# Altium footprint library PCBLIB.PcbLib: 557 footprints (part 25 of 36)
Each footprint in its own frame and in the unit in brackets; x right, y up, seen from the top. Pads: shape width x height; smd on the part's side, far side on the other; paste and mask are expansions set on the pad; w line width, h text height; cw(c..) or ccw(c..) is an arc to the next point about the centre after c.
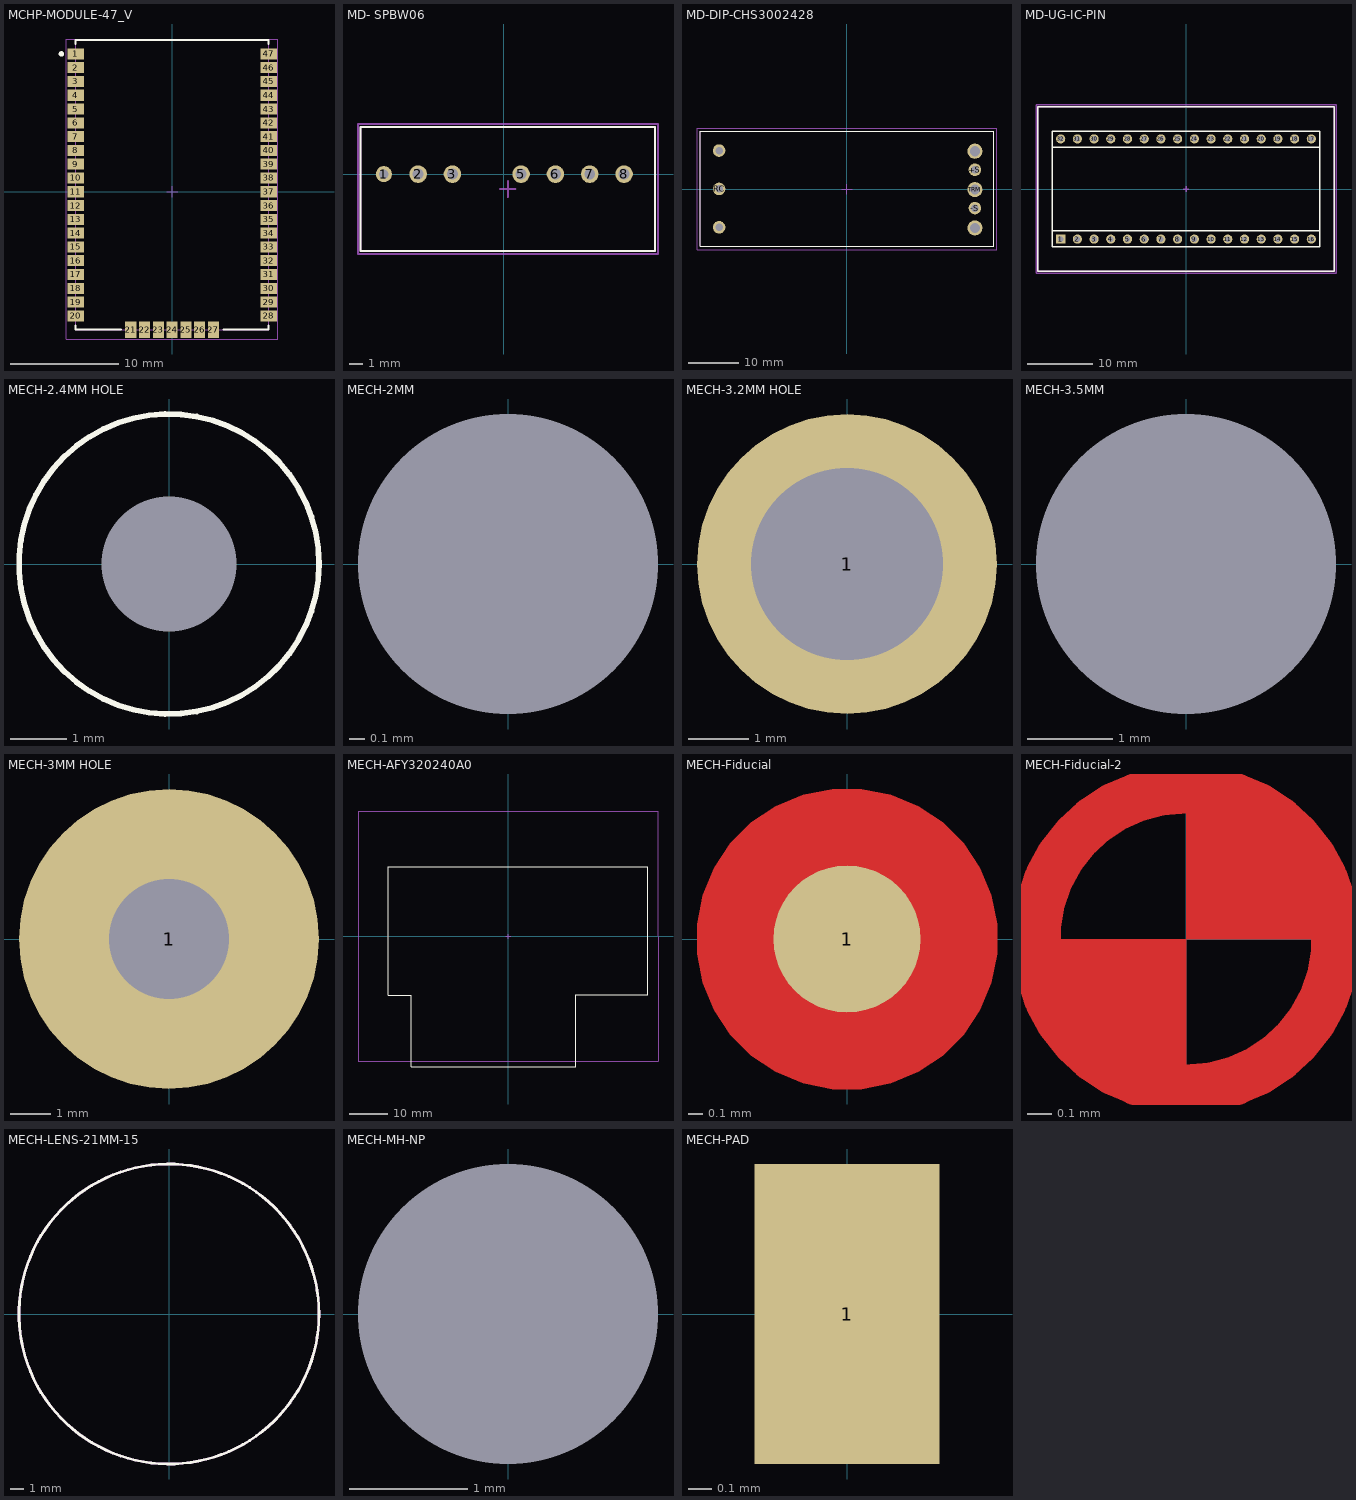
[diagram p24: the footprints below, top view; thin cyan lines are the x and y axes]

## MCHP-MODULE-47_V [mil] "SMD, 47-Leads, Body 26.67x17.78mm, Pitch 1.27mm"
height 131.5
pads (47):
  rect 60x40 smd mask+3.94: 1(-350,500) 2(-350,450) 3(-350,400) 4(-350,350) 5(-350,300) 6(-350,250) 7(-350,200) 8(-350,150) 9(-350,100) 10(-350,50) 11(-350,0) 12(-350,-50) 13(-350,-100) 14(-350,-150) 15(-350,-200) 16(-350,-250) 17(-350,-300) 18(-350,-350) 19(-350,-400) 20(-350,-450) 28(350,-450) 29(350,-400) 30(350,-350) 31(350,-300) 32(350,-250) 33(350,-200) 34(350,-150) 35(350,-100) 36(350,-50) 37(350,0) 38(350,50) 39(350,100) 40(350,150) 41(350,200) 42(350,250) 43(350,300) 44(350,350) 45(350,400) 46(350,450) 47(350,500)
  rect 40x60 smd mask+3.94: 21(-150,-500) 22(-100,-500) 23(-50,-500) 24(0,-500) 25(50,-500) 26(100,-500) 27(150,-500)
Top Overlay:
  circle w9.84: c-401.65,500 r4.92
  lines w7.87: -350,-485.75 -350,-500 -185.75,-500 ; -350,535.75 -350,550 350,550 350,535.75 ; 185.75,-500 350,-500 350,-485.75
Mechanical 15:
  lines w1.97: -383.94,-533.94 -383.94,553.94 383.94,553.94 383.94,-533.94 -383.94,-533.94
  lines w3.94: -19.68,0 19.69,0 ; 0,-19.68 0,19.68
ASM Top:
  lines w3.94: -350,-500 350,-500 350,550 -350,550 -350,-500
  text ".designator" at -74.8,0 h31.5
3D body "User Library-RN2483-1.STEP": height 131.5, standoff -0.04, extent -350,-500 350,550

## MD- SPBW06 [mm]
height 11.1
pads (7):
  round 1.2 hole 0.7 mask+0.05: 1(-8.89,0)
  round 1.3 hole 0.8 mask+0.05: 2(-6.35,0) 3(-3.81,0) 5(1.27,0) 6(3.81,0) 7(6.35,0) 8(8.89,0)
Top Overlay:
  lines w0.15: -10.614,-5.7 11.186,-5.7 11.186,3.5 -10.614,3.5 -10.614,-5.7
Mechanical 15:
  lines w0.15: -0.3,-1.1 0.286,-1.1 ; 0.286,-0.514 0.286,-1.1 ; 0.3,-1.7 0.286,-1.686 0.286,-1.1 ; 0.871,-1.1 0.286,-1.1 ; -10.8,-5.9 -10.8,3.7 11.4,3.7 11.4,-5.9 -10.8,-5.9
ASM Top:
  lines w0.15: -10.614,-5.7 -10.614,3.5 11.186,3.5 11.186,-5.7 -10.614,-5.7
  text ".designator" at -0.5,-1.1 h1.5
3D body "SPBW06.STEP": height 11.11, standoff -4.09, extent -10.614,-5.7 11.186,3.5

## MD-DIP-CHS3002428 [mm]
height 11
pads (8):
  round 2.5 hole 1.5 unplated: +S(25.4,3.874) +VIN(-25.4,7.684) -S(25.4,-3.746) -VIN(-25.4,-7.556) RC(-25.4,0.064)
  round 3 hole 2 unplated: +VOUT(25.4,7.555) -VOUT(25.4,-7.684) TRM(25.4,-0.065)
Top Overlay:
  lines w0.15: -29.2,-11.366 -29.2,11.494 29.2,11.494 29.2,-11.366 -29.2,-11.366
Mechanical 15:
  lines w0.15: -1,0 0,0 ; 0,-1 0,0 ; 0,1 0,0 ; 1,0 0,0 ; -29.8,-12 -29.8,11.75 -29.8,12.1 29.8,12.1 29.8,-12 -29.8,-12
ASM Top:
  lines w0.15: 29.2,-11.366 -29.2,-11.366 -29.2,11.494 29.2,11.494 29.2,-11.366 ; 29.2,-11.366 29.2,-11.366
  text ".designator" at -0.2,-0.1 h1.5
3D body "chs300(stp).stp": height 10.91, standoff -3.17, extent -29.2,-11.366 29.2,11.494

## MD-UG-IC-PIN [mil]
height 433.07
pads (32):
  rect 55x55 / inner round 0 / far side rect 55x55 hole 32: 1(-750,-300)
  round 55 / inner round 0 / far side round 55 hole 32: 2(-650,-300) 3(-550,-300) 4(-450,-300) 5(-350,-300) 6(-250,-300) 7(-150,-300) 8(-50,-300) 9(50,-300) 10(150,-300) 11(250,-300) 12(350,-300) 13(450,-300) 14(550,-300) 15(650,-300) 16(750,-300) 17(750,300) 18(650,300) 19(550,300) 20(450,300) 21(350,300) 22(250,300) 23(150,300) 24(50,300) 25(-50,300) 26(-150,300) 27(-250,300) 28(-350,300) 29(-450,300) 30(-550,300) 31(-650,300) 32(-750,300)
Top Overlay:
  lines w3: -799.21,208.66 -799.21,-208.66 ; 799.21,-208.66 799.21,208.66 ; -799.21,-208.66 -799.21,-346.46 799.21,-346.46 799.21,208.66 ; -799.21,-208.66 -799.21,346.46 799.21,346.46 799.21,208.66
  lines w7.87: -799.21,-250.79 799.21,-250.79 ; -799.21,250.79 799.21,250.79 ; -885.83,-492.13 885.83,-492.13 885.83,492.13 -885.83,492.13 -885.83,-492.13 ; -799.21,-346.46 799.21,-346.46 799.21,346.46 -799.21,346.46 -799.21,-346.46
Mechanical 15:
  lines w7.87: -15.75,0 15.75,0 ; 0,0 0,-15.75 0,15.75 ; -897.64,-503.94 -897.64,503.94 897.64,503.94 897.64,-503.94 893.7,-503.94 -897.64,-503.94
ASM Top:
  lines w7.87: -885.83,-492.13 -885.83,492.13 885.83,492.13 885.83,-492.13 -885.83,-492.13
  text ".designator" at -3.94,9.41 h31.5
3D body: height 62.99, standoff 0, extent -885.83,-492.13 885.83,492.13

## MECH-2.4MM HOLE [mm]
pads (1):
  round 0.1 hole 2.4 unplated: 1(0,0)
Top Overlay:
  circle w0.102: c0,0 r2.67

## MECH-2MM [mil]
pads (1):
  round 1 hole 78 unplated: 1(0,0)

## MECH-3.2MM HOLE [mm]
pads (1):
  round 5 hole 3.2: 1(0,0)
3D body "M3x6_MB_Civata.STEP": height 2.46, standoff -5.9, extent -2.8,-2.8 2.803,2.8

## MECH-3.5MM [mil]
pads (1):
  round 1 hole 137.8 unplated: 1(0,0)

## MECH-3MM HOLE [mm]
pads (1):
  round 7.5 hole 3: 1(0,0)

## MECH-AFY320240A0 [mm]
height 2.77
Top Overlay:
  lines w0.2: -31,-15.22 -24.98,-15.22 -24.98,-33.7 -11.633,-33.7 15.092,-33.7 17.45,-33.7 17.45,-32.266 17.45,-15.066 36,-15.066 36,17.934 -31,17.934 -31,-15.22
Mechanical 15:
  lines w0.2: -0.6,0 0.6,0 ; 0,-0.6 0,0.6 ; -38.8,-32.266 38.7,-32.266 38.7,32.334 -38.8,32.334 -38.8,-32.266
3D body "EVE3-35A-TPR.step": height 4.41, standoff -3.52, extent -38.5,-33.666 38.4,32.334

## MECH-Fiducial [mm]
pads (1):
  round 1 smd mask+0.5: 1(0,0)
Top Layer:
  pour cut-out: 0,-1.02 -0.1,-1.02 -0.297,-0.981 -0.483,-0.904 -0.65,-0.792 -0.792,-0.65 -0.904,-0.483 -0.981,-0.297 -1.02,-0.1 -1.02,0 -1.02,0.1 -0.981,0.297 -0.904,0.483 -0.792,0.65 -0.65,0.792 -0.483,0.904 -0.297,0.981 -0.1,1.02 0,1.02 0.1,1.02 0.297,0.981 0.483,0.904 0.65,0.792 0.792,0.65 0.904,0.483 0.981,0.297 1.02,0.1 1.02,0 1.02,-0.1 0.981,-0.297 0.904,-0.483 0.792,-0.65 0.65,-0.792 0.483,-0.904 0.297,-0.981 0.1,-1.02

## MECH-Fiducial-2 [mm] "Fiducial"
Top Layer:
  region: 0,-0.625 -0.375,-0.5 -0.625,-0.25 -0.625,0 0,0
  region: 0.625,0 0,0 0,0.625 0.375,0.5 0.625,0.25
  lines w0.203: 0,-0.625 ccw(c0,0) 0,0.625 ccw(c0,0) 0,-0.625
Top Solder:
  circle w0.203: c0,0 r0.625
  region: 0.625,0 0.5,-0.375 0.25,-0.625 -0.25,-0.625 -0.5,-0.375 -0.625,0 -0.5,0.375 -0.375,0.5 0,0.625 0.375,0.5 0.5,0.25 0.5,0.375 0.375,0.5

## MECH-LENS-21MM-15 [mm]
height 14.28
Top Overlay:
  circle w0.2: c0,0 r10.8
ASM Top:
  circle w0.2: c0,0 r10.8
  text ".designator" at 0,0 h0.8
3D body "IRENE-Assy_Mech 20121115_pv.stp": height 14.29, standoff -1.28, extent -10.78,-10.78 10.78,10.78

## MECH-MH-NP [mm]
pads (1):
  round 0 hole 2.54 unplated: 1(0,0)

## MECH-PAD [mm]
pads (1):
  rect 0.8x1.3 smd: 1(0,0)

## MECH-PCBCODE [mm]
Top Overlay:
  text ".PCBCODE" at 0,0 h1.5